# Altium footprint library PcbLib.PcbLib: 141 footprints (part 8 of 9)
Each footprint in its own frame and in the unit in brackets; x right, y up, seen from the top. Pads: shape width x height; smd on the part's side, far side on the other; paste and mask are expansions set on the pad; w line width, h text height; cw(c..) or ccw(c..) is an arc to the next point about the centre after c.
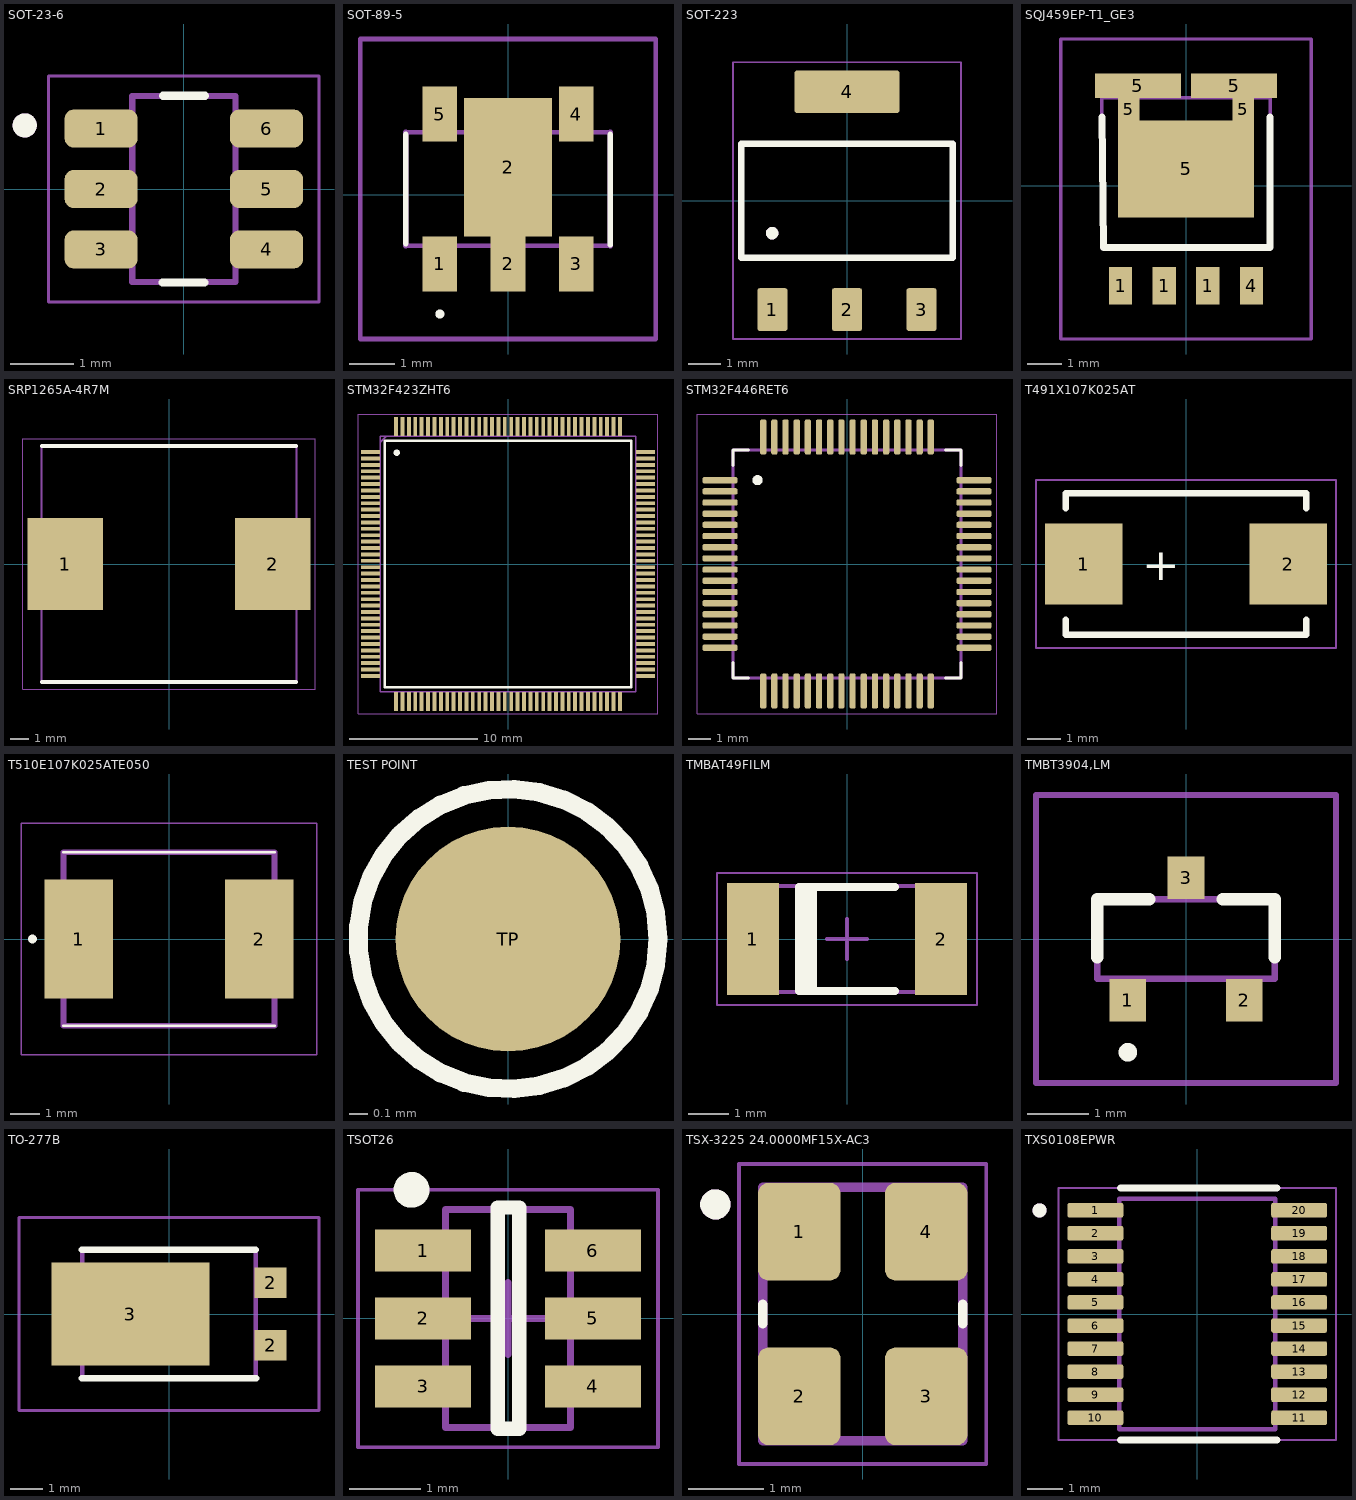
[diagram p7: the footprints below, top view; thin cyan lines are the x and y axes]

## SOT-23-6 [mm]
pads (6):
  rrect50% 1.15x0.6 smd: 1(-1.3,0.95) 2(-1.3,0) 3(-1.3,-0.95) 4(1.3,-0.95) 5(1.3,0) 6(1.3,0.95)
Top Overlay:
  circle w0.2: c-2.5,1 r0.09
  lines w0.127: -0.335,-1.469 0.325,-1.469 ; -0.325,1.466 0.335,1.466
Mechanical 13:
  circle w0.2: c-2.5,1 r0.09
  lines w0.1: -0.812,-1.462 -0.812,1.462 0.812,1.462 0.812,-1.462 -0.812,-1.462
Mechanical 15:
  lines w0.05: -2.125,-1.775 2.125,-1.775 2.125,1.775 -2.125,1.775 -2.125,-1.775
3D body "ESDA6V1BC6.stp": height 1.45, standoff 0, extent -1.4,-1.462 1.4,1.462

## SOT-89-5 [mm]
pads (6):
  rect 0.76x1.2 smd: 1(-1.5,-1.523) 2(0,-1.523) 3(1.5,-1.523) 4(1.5,1.777) 5(-1.5,1.777)
  rect 1.93x3.05 smd: 2(0,0.602)
Top Overlay:
  lines w0.1: -1.5,-2.673 cw(c-1.5,-2.623) -1.5,-2.573 cw(c-1.5,-2.623) -1.5,-2.673
  lines w0.125: -2.25,-1.073 -2.25,1.327 ; 2.25,-1.098 2.25,1.327
Mechanical 13:
  lines w0.1: -2.25,-1.123 2.25,-1.123 ; -2.25,1.377 2.25,1.377
  lines w0.127: -2.25,-1.123 -2.25,1.377 ; 2.25,-1.123 2.25,1.377
Mechanical 15:
  lines w0.1: -3.25,-3.173 -3.25,3.427 3.25,3.427 3.25,-3.173 -3.25,-3.173
3D body "AP7361C-Y5-13.stp": height 1.35, standoff 0, extent -2.3,-2.373 2.3,2.627

## SOT-223 [mm]
pads (4):
  rrect15% 0.93x1.31 smd: 1(-2.29,-3.345) 2(0,-3.345) 3(2.29,-3.345)
  rrect15% 3.24x1.31 smd: 4(0,3.345)
Top Overlay:
  circle w0.2: c-2.3,-1 r0.09
  lines w0.2: -3.253,-1.753 -3.253,1.753 3.253,1.753 3.253,-1.753 -3.253,-1.753
Mechanical 13:
  circle w0.2: c-2.3,-1 r0.09
  lines w0.127: -3.253,-1.753 -3.253,1.753 3.253,1.753 3.253,-1.753 -3.253,-1.753
Mechanical 15:
  lines w0.05: -3.502,-4.25 -3.502,4.25 3.502,4.25 3.502,-4.25 -3.502,-4.25
3D body "step_temp.STEP": height 1.8, standoff 0, extent -3.251,-3.499 3.251,3.499

## SQJ459EP-T1_GE3 [mm]
pads (9):
  rect 0.68x1.1 smd: 1(-1.905,-2.913) 1(-0.635,-2.913) 1(0.635,-2.913) 4(1.905,-2.913)
  rect 0.63x0.66 smd: 5(-1.665,2.228) 5(1.665,2.228)
  rect 2.5x0.71 smd: 5(-1.4,2.913) 5(1.4,2.913)
  rect 3.96x2.82 smd: 5(0,0.487)
Top Overlay:
  lines w0.2: -2.447,2.001 -2.4,-1.8 2.45,-1.8 2.45,2
Mechanical 15:
  lines w0.1: -2.45,-1.812 2.45,-1.812 2.45,2.558 -2.45,2.558 -2.45,-1.812
Mechanical 20:
  lines w0.1: -3.65,-4.463 3.65,-4.463 3.65,4.268 -3.65,4.268 -3.65,-4.463
3D body "POWERPAK SO-8L.stp": height 1.11, standoff -0.18, extent -2.45,-3.257 2.45,2.913

## SRP1265A-4R7M [mm]
pads (2):
  rect 4x4.9 smd: 1(-5.5,0) 2(5.5,0)
Top Overlay:
  lines w0.2: -6.75,-6.25 6.75,-6.25 ; -6.75,6.25 6.75,6.25
Mechanical 15:
  lines w0.1: -6.75,-6.25 6.75,-6.25 6.75,6.25 -6.75,6.25 -6.75,-6.25
Mechanical 20:
  lines w0.05: -7.75,-6.65 7.75,-6.65 7.75,6.65 -7.75,6.65 -7.75,-6.65
3D body "SPR1265.step": height 6.51, standoff 0, extent -7.252,-6.401 7.252,6.401

## STM32F423ZHT6 [mm]
pads (144):
  rect 1.475x0.3 smd: 1(-10.738,8.75) 2(-10.738,8.25) 3(-10.738,7.75) 4(-10.738,7.25) 5(-10.738,6.75) 6(-10.738,6.25) 7(-10.738,5.75) 8(-10.738,5.25) 9(-10.738,4.75) 10(-10.738,4.25) 11(-10.738,3.75) 12(-10.738,3.25) 13(-10.738,2.75) 14(-10.738,2.25) 15(-10.738,1.75) 16(-10.738,1.25) 17(-10.738,0.75) 18(-10.738,0.25) 19(-10.738,-0.25) 20(-10.738,-0.75) 21(-10.738,-1.25) 22(-10.738,-1.75) 23(-10.738,-2.25) 24(-10.738,-2.75) 25(-10.738,-3.25) 26(-10.738,-3.75) 27(-10.738,-4.25) 28(-10.738,-4.75) 29(-10.738,-5.25) 30(-10.738,-5.75) 31(-10.738,-6.25) 32(-10.738,-6.75) 33(-10.738,-7.25) 34(-10.738,-7.75) 35(-10.738,-8.25) 36(-10.738,-8.75) 73(10.738,-8.75) 74(10.738,-8.25) 75(10.738,-7.75) 76(10.738,-7.25) 77(10.738,-6.75) 78(10.738,-6.25) 79(10.738,-5.75) 80(10.738,-5.25) 81(10.738,-4.75) 82(10.738,-4.25) 83(10.738,-3.75) 84(10.738,-3.25) 85(10.738,-2.75) 86(10.738,-2.25) 87(10.738,-1.75) 88(10.738,-1.25) 89(10.738,-0.75) 90(10.738,-0.25) 91(10.738,0.25) 92(10.738,0.75) 93(10.738,1.25) 94(10.738,1.75) 95(10.738,2.25) 96(10.738,2.75) 97(10.738,3.25) 98(10.738,3.75) 99(10.738,4.25) 100(10.738,4.75) 101(10.738,5.25) 102(10.738,5.75) 103(10.738,6.25) 104(10.738,6.75) 105(10.738,7.25) 106(10.738,7.75) 107(10.738,8.25) 108(10.738,8.75)
  rect 0.3x1.475 smd: 37(-8.75,-10.738) 38(-8.25,-10.738) 39(-7.75,-10.738) 40(-7.25,-10.738) 41(-6.75,-10.738) 42(-6.25,-10.738) 43(-5.75,-10.738) 44(-5.25,-10.738) 45(-4.75,-10.738) 46(-4.25,-10.738) 47(-3.75,-10.738) 48(-3.25,-10.738) 49(-2.75,-10.738) 50(-2.25,-10.738) 51(-1.75,-10.738) 52(-1.25,-10.738) 53(-0.75,-10.738) 54(-0.25,-10.738) 55(0.25,-10.738) 56(0.75,-10.738) 57(1.25,-10.738) 58(1.75,-10.738) 59(2.25,-10.738) 60(2.75,-10.738) 61(3.25,-10.738) 62(3.75,-10.738) 63(4.25,-10.738) 64(4.75,-10.738) 65(5.25,-10.738) 66(5.75,-10.738) 67(6.25,-10.738) 68(6.75,-10.738) 69(7.25,-10.738) 70(7.75,-10.738) 71(8.25,-10.738) 72(8.75,-10.738) 109(8.75,10.738) 110(8.25,10.738) 111(7.75,10.738) 112(7.25,10.738) 113(6.75,10.738) 114(6.25,10.738) 115(5.75,10.738) 116(5.25,10.738) 117(4.75,10.738) 118(4.25,10.738) 119(3.75,10.738) 120(3.25,10.738) 121(2.75,10.738) 122(2.25,10.738) 123(1.75,10.738) 124(1.25,10.738) 125(0.75,10.738) 126(0.25,10.738) 127(-0.25,10.738) 128(-0.75,10.738) 129(-1.25,10.738) 130(-1.75,10.738) 131(-2.25,10.738) 132(-2.75,10.738) 133(-3.25,10.738) 134(-3.75,10.738) 135(-4.25,10.738) 136(-4.75,10.738) 137(-5.25,10.738) 138(-5.75,10.738) 139(-6.25,10.738) 140(-6.75,10.738) 141(-7.25,10.738) 142(-7.75,10.738) 143(-8.25,10.738) 144(-8.75,10.738)
Top Overlay:
  circle w0.25: c-8.7,8.7 r0.125
  lines w0.2: -9.65,-9.65 9.65,-9.65 9.65,9.65 -9.65,9.65 -9.65,-9.65
Mechanical 15:
  lines w0.1: -10,9.5 -9.5,10 ; -10,-10 10,-10 10,10 -10,10 -10,-10
Mechanical 20:
  lines w0.05: -11.725,-11.725 11.725,-11.725 11.725,11.725 -11.725,11.725 -11.725,-11.725
3D body "STM32F423ZHT6.stp": height 1.6, standoff 0, extent -11,-11 11,11

## STM32F446RET6 [mm]
pads (64):
  rrect50% 1.56x0.28 smd: 1(-5.68,3.75) 2(-5.68,3.25) 3(-5.68,2.75) 4(-5.68,2.25) 5(-5.68,1.75) 6(-5.68,1.25) 7(-5.68,0.75) 8(-5.68,0.25) 9(-5.68,-0.25) 10(-5.68,-0.75) 11(-5.68,-1.25) 12(-5.68,-1.75) 13(-5.68,-2.25) 14(-5.68,-2.75) 15(-5.68,-3.25) 16(-5.68,-3.75) 33(5.68,-3.75) 34(5.68,-3.25) 35(5.68,-2.75) 36(5.68,-2.25) 37(5.68,-1.75) 38(5.68,-1.25) 39(5.68,-0.75) 40(5.68,-0.25) 41(5.68,0.25) 42(5.68,0.75) 43(5.68,1.25) 44(5.68,1.75) 45(5.68,2.25) 46(5.68,2.75) 47(5.68,3.25) 48(5.68,3.75)
  rrect50% 0.28x1.56 smd: 17(-3.75,-5.68) 18(-3.25,-5.68) 19(-2.75,-5.68) 20(-2.25,-5.68) 21(-1.75,-5.68) 22(-1.25,-5.68) 23(-0.75,-5.68) 24(-0.25,-5.68) 25(0.25,-5.68) 26(0.75,-5.68) 27(1.25,-5.68) 28(1.75,-5.68) 29(2.25,-5.68) 30(2.75,-5.68) 31(3.25,-5.68) 32(3.75,-5.68) 49(3.75,5.68) 50(3.25,5.68) 51(2.75,5.68) 52(2.25,5.68) 53(1.75,5.68) 54(1.25,5.68) 55(0.75,5.68) 56(0.25,5.68) 57(-0.25,5.68) 58(-0.75,5.68) 59(-1.25,5.68) 60(-1.75,5.68) 61(-2.25,5.68) 62(-2.75,5.68) 63(-3.25,5.68) 64(-3.75,5.68)
Top Overlay:
  circle w0.254: c-4,3.75 r0.1
  lines w0.127: -5.1,-4.4 -5.1,-5.1 -4.4,-5.1 ; -5.1,4.4 -5.1,5.1 -4.4,5.1 ; 4.4,-5.1 5.1,-5.1 5.1,-4.4 ; 4.4,5.1 5.1,5.1 5.1,4.4
Mechanical 13:
  circle w0.2: c-4,3.75 r0.1
  lines w0.127: -5.1,-5.1 -5.1,5.1 5.1,5.1 5.1,-5.1 -5.1,-5.1
Mechanical 15:
  lines w0.05: -6.71,-6.71 -6.71,6.71 6.71,6.71 6.71,-6.71 -6.71,-6.71
3D body "STM32F446RET6.step": height 1.6, standoff 0, extent -5.997,-5.997 5.997,5.997

## T491X107K025AT [mm]
pads (2):
  rect 2.35x2.45 smd: 1(-3.1,0) 2(3.1,0)
Top Overlay:
  lines w0.2: -3.65,-1.7 -3.65,-2.15 3.65,-2.15 3.65,-1.7 ; -3.65,1.7 -3.65,2.15 3.65,2.15 3.65,1.7
  text "+" at -1.333,-0.5 h1
Mechanical 15:
  lines w0.05: -4.55,-2.55 4.55,-2.55 4.55,2.55 -4.55,2.55 -4.55,-2.55
3D body "step_temp.STEP": height 4.3, standoff 0, extent -3.65,-2.15 3.65,2.15

## T510E107K025ATE050 [mm]
pads (2):
  rect 2.37x4.13 smd: 1(-3.12,0) 2(3.12,0)
Top Overlay:
  circle w0.2: c-4.72,0 r0.05
  lines w0.1: -3.65,-3 3.65,-3 ; -3.65,3 3.65,3
Mechanical 13:
  lines w0.2: -3.65,-3 3.65,-3 3.65,3 -3.65,3 -3.65,-3
Mechanical 15:
  lines w0.05: -5.105,-4 5.105,-4 5.105,4 -5.105,4 -5.105,-4
3D body "T510E107K025ATE050.stp": height 3.8, standoff 0, extent -3.8,-3.15 3.8,3.15

## TEST POINT [mm]
pads (1):
  round 1.2 smd paste-0.6: TP(0,0)
Top Overlay:
  circle w0.1: c0,0 r0.8
3D body: height 0.03, standoff 0, extent -0.6,-0.6 0.6,0.6

## TMBAT49FILM [mm]
pads (2):
  rect 1.3x2.8 smd: 1(-2.35,0) 2(2.35,0)
Top Overlay:
  rectangle: -1.3,-1.3 -0.75,1.3
  lines w0.2: -1.2,-1.3 1.2,-1.3 ; -1.2,1.3 1.2,1.3
Mechanical 13:
  lines w0.1: -2.6,-1.325 -2.6,1.325 2.6,1.325 2.6,-1.325 -2.6,-1.325
Mechanical 15:
  lines w0.05: -3.25,-1.65 -3.25,1.65 3.25,1.65 3.25,-1.65 -3.25,-1.65
  lines w0.1: -0.5,0 0.5,0 ; 0,-0.5 0,0.5
3D body: height 2.64, standoff 0, extent -2.6,-1.325 -2,1.32
3D body: height 2.63, standoff 0.04, extent -1.4,-1.296 -0.8,1.291
3D body: height 2.62, standoff 0.04, extent -2,-1.295 2,1.29
3D body: height 2.64, standoff 0, extent 2,-1.325 2.6,1.32

## TMBT3904,LM [mm]
pads (3):
  rect 0.6x0.7 smd: 1(-0.95,-1) 2(0.95,-1) 3(0,1)
Top Overlay:
  lines w0.2: -1.45,-0.3 -1.45,0.65 -0.6,0.65 ; 0.6,0.65 1.45,0.65 1.45,-0.3 ; -0.95,-1.9 cw(c-0.95,-1.85) -0.95,-1.8 ; -0.95,-1.9 ccw(c-0.95,-1.85) -0.95,-1.8 ; -0.95,-1.9 cw(c-0.95,-1.85) -0.95,-1.8
Mechanical 15:
  lines w0.1: -1.45,-0.65 1.45,-0.65 1.45,0.65 -1.45,0.65 -1.45,-0.65
Mechanical 20:
  lines w0.1: -2.45,-2.35 2.45,-2.35 2.45,2.35 -2.45,2.35 -2.45,-2.35
3D body "SOT23.stp": height 1, standoff -0.03, extent -1.4,-1.223 1.5,1.192

## TO-277B [mm]
pads (3):
  rect 1x0.95 smd: 2(3.15,-0.97) 2(3.15,0.97)
  rect 4.9x3.2 smd: 3(-1.2,0)
Top Overlay:
  lines w0.2: -2.7,-1.99 2.7,-1.99 ; -2.7,1.99 2.69,1.99
Mechanical 15:
  lines w0.127: -2.69,-1.99 2.69,-1.99 2.69,1.99 -2.69,1.99 -2.69,-1.99
Mechanical 20:
  lines w0.1: -4.65,-2.99 4.65,-2.99 4.65,2.99 -4.65,2.99 -4.65,-2.99
3D body "TO-277B.stp": height 1.35, standoff 0, extent -3.33,-1.99 3.555,1.99

## TSOT26 [mm]
pads (6):
  rect 1.34x0.59 smd: 1(-1.19,0.95) 2(-1.19,0) 3(-1.19,-0.95) 4(1.19,-0.95) 5(1.19,0) 6(1.19,0.95)
Top Overlay:
  circle w0.25: c-1.35,1.8 r0.125
  lines w0.2: -0.142,-1.545 0.158,-1.545 0.158,1.555 -0.142,1.555 -0.142,-1.545
Top Courtyard:
  lines w0.05: -2.1,-1.8 2.1,-1.8 2.1,1.8 -2.1,1.8 -2.1,-1.8
  lines w0.1: -0.5,0 0.5,0 ; 0,-0.5 0,0.5
Top Assembly:
  lines w0.1: -0.875,-1.525 0.875,-1.525 0.875,1.525 -0.875,1.525 -0.875,-1.525
3D body "step_temp.STEP": height 1, standoff 0, extent -1.45,-1.45 1.45,1.45

## TSX-3225 24.0000MF15X-AC3 [mm]
pads (4):
  rrect25% 1.09x1.29 smd: 1(-0.84,1.09) 2(-0.84,-1.09) 3(0.84,-1.09) 4(0.84,1.09)
Top Overlay:
  circle w0.2: c-1.95,1.45 r0.1
  lines w0.127: -1.325,-0.132 -1.325,0.132 ; 1.325,-0.132 1.325,0.132
Mechanical 13:
  circle w0.2: c-1.95,1.45 r0.1
  lines w0.127: -1.325,-1.675 1.325,-1.675 1.325,1.675 -1.325,1.675 -1.325,-1.675
Mechanical 15:
  lines w0.05: -1.635,-1.985 1.635,-1.985 1.635,1.985 -1.635,1.985 -1.635,-1.985
3D body "TSX-3225 24.0000MF15X-AC3.STEP": height 0.6, standoff 0, extent -1.25,-1.6 1.25,1.6

## TXS0108EPWR [mm]
pads (20):
  rrect25% 1.57x0.41 smd: 1(-2.87,2.925) 2(-2.87,2.275) 3(-2.87,1.625) 4(-2.87,0.975) 5(-2.87,0.325) 6(-2.87,-0.325) 7(-2.87,-0.975) 8(-2.87,-1.625) 9(-2.87,-2.275) 10(-2.87,-2.925) 11(2.87,-2.925) 12(2.87,-2.275) 13(2.87,-1.625) 14(2.87,-0.975) 15(2.87,-0.325) 16(2.87,0.325) 17(2.87,0.975) 18(2.87,1.625) 19(2.87,2.275) 20(2.87,2.925)
Top Overlay:
  circle w0.2: c-4.445,2.921 r0.1
  lines w0.2: -2.159,-3.556 2.241,-3.556 ; -2.159,3.556 2.241,3.556
Mechanical 13:
  circle w0.2: c-4.445,2.921 r0.1
  lines w0.127: -2.2,-3.25 -2.2,3.25 2.2,3.25 2.2,-3.25 -2.2,-3.25
Mechanical 15:
  lines w0.05: -3.91,-3.55 -3.91,3.55 3.91,3.55 3.91,-3.55 -3.91,-3.55
3D body "step_temp.STEP": height 1.2, standoff 0, extent -3.2,-3.25 3.2,3.25